# Altium footprint library connecteurs.PcbLib: 162 footprints (part 9 of 11)
Each footprint in its own frame and in the unit in brackets; x right, y up, seen from the top. Pads: shape width x height; smd on the part's side, far side on the other; paste and mask are expansions set on the pad; w line width, h text height; cw(c..) or ccw(c..) is an arc to the next point about the centre after c.
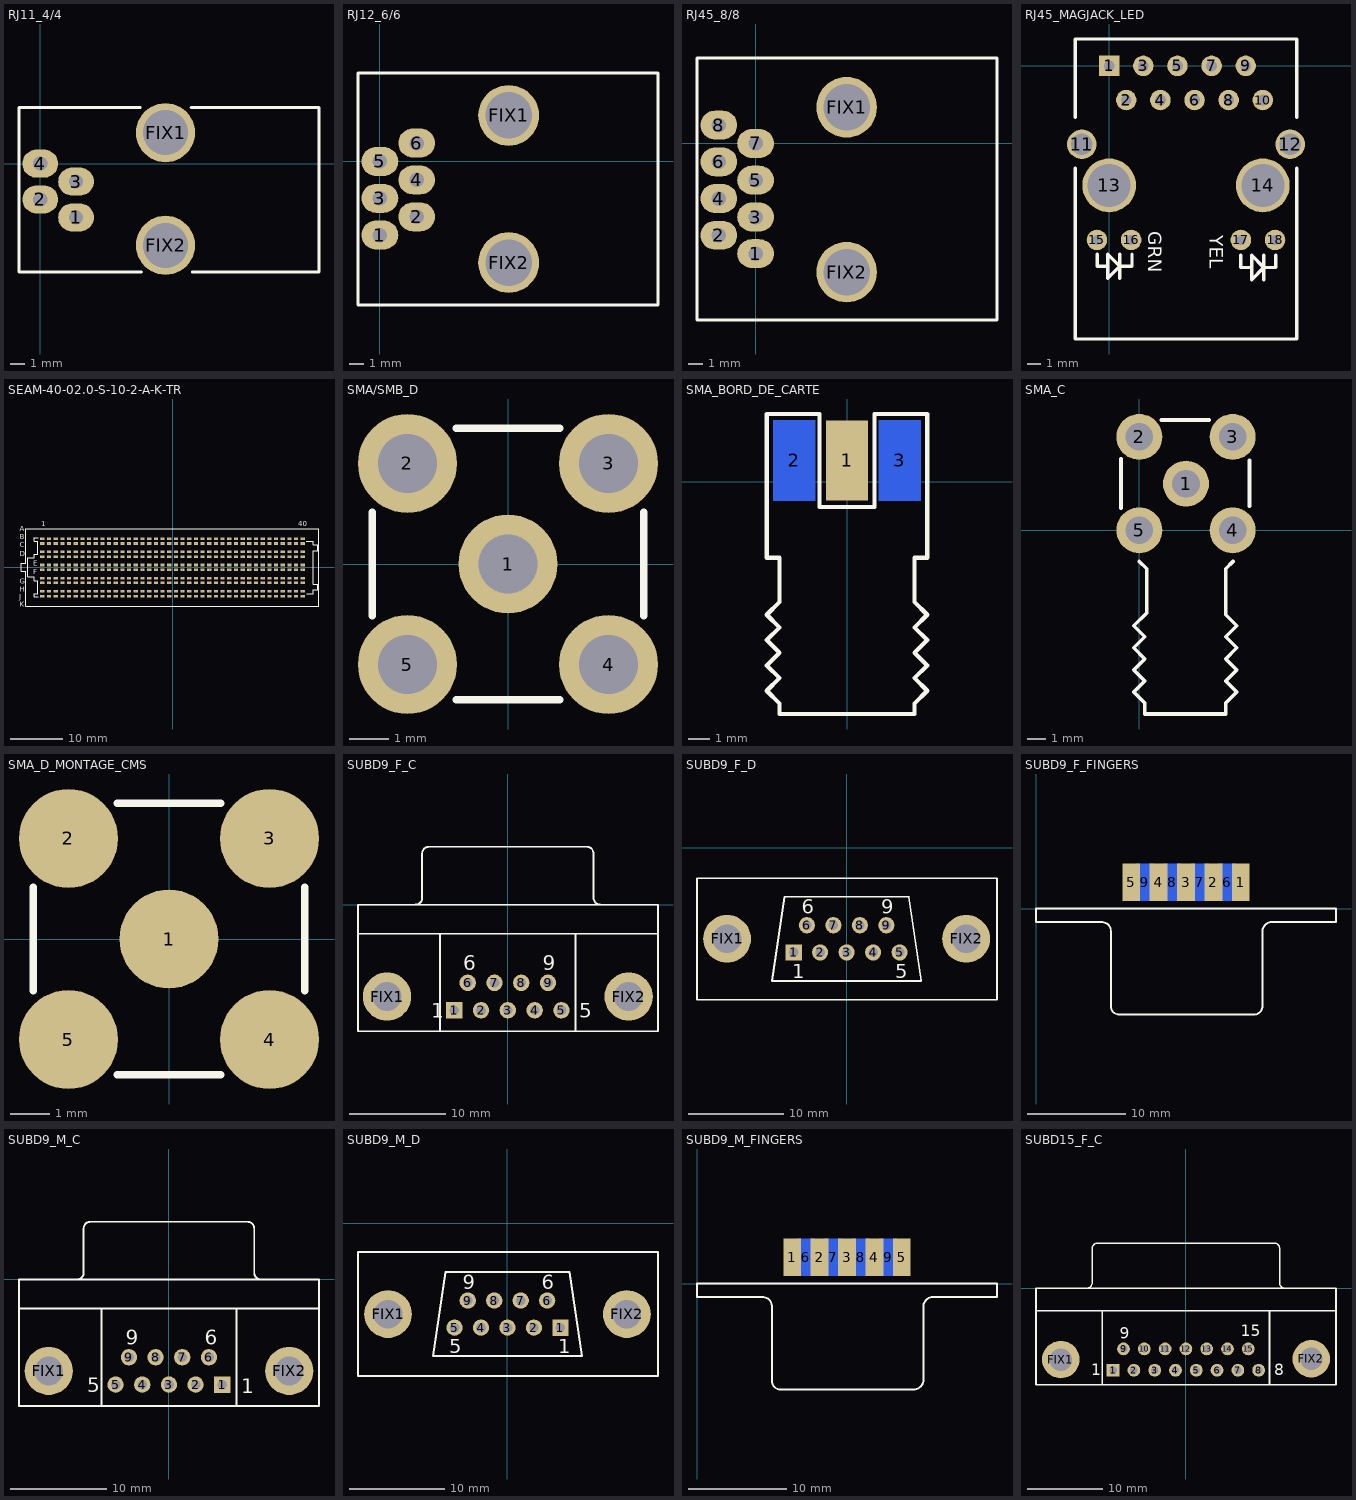
[diagram p8: the footprints below, top view; thin cyan lines are the x and y axes]

## RJ11_4/4 [mm] "RJ11; 4P/4C; BAS PROFIL ; COUDE ; ESPACEMENT BROCHES = 2.54mm"
height 16
pads (6):
  oval 2.54x2 hole 1: 1(2.54,-3.82) 2(0,-2.54) 3(2.54,-1.27) 4(0,0)
  round 4.2 hole 3.2: FIX1(8.9,2.2) FIX2(8.9,-5.8)
Top Overlay:
  lines w0.2: 7.1,4 -1.51,4 -1.51,-7.7 7.2,-7.7 ; 10.7,4 19.8,4 19.8,-7.7 10.8,-7.7
3D body: height 15.99, standoff -3.46, extent -0.985,-7.4 19.585,3.78

## RJ12_6/6 [mm] "RJ12 ; 6P/6C ; BAS PROFIL ; COUDE ; ESPACEMENT BROCHES = 2.54 mm"
height 16
pads (8):
  oval 2.54x2 hole 1: 1(0,-5.08) 2(2.54,-3.82) 3(0,-2.54) 4(2.54,-1.27) 5(0,0) 6(2.54,1.27)
  round 4.2 hole 3.2: FIX1(8.89,3.18) FIX2(8.89,-6.98)
Top Overlay:
  lines w0.2: -1.51,-9.89 -1.51,6.1 7.1,6.1 19.2,6.1 19.2,-9.9 -1.5,-9.9 -1.51,-9.89
3D body: height 16, standoff -4, extent -1.6,-9.8 18.97,5.95

## RJ45_8/8 [mm] "RJ45 ; 8P/8C ; BAS PROFIL ; COUDE ; ESPACEMENT BROCHES = 2.54mm"
height 16
pads (10):
  oval 2.54x2 hole 1: 1(0,-7.62) 2(-2.54,-6.35) 3(0,-5.09) 4(-2.54,-3.81) 5(0,-2.54) 6(-2.54,-1.27) 7(0,0) 8(-2.54,1.27)
  round 4.2 hole 3.2: FIX1(6.3,2.5) FIX2(6.3,-8.9)
Top Overlay:
  lines w0.2: -4.05,-12.2 -4.05,5.9 2.09,5.9 ; -3.985,-12.2 16.7,-12.2 16.7,5.9 2.1,5.9
3D body: height 16, standoff -4, extent -3.985,-12.1 16.585,5.68

## RJ45_MAGJACK_LED [mm]
pads (18):
  rect 1.524x1.524 hole 0.8: 1(0,0)
  round 1.524 hole 0.8: 2(1.27,-2.54) 3(2.54,0) 4(3.81,-2.54) 5(5.08,0) 6(6.35,-2.54) 7(7.62,0) 8(8.89,-2.54) 9(10.16,0) 10(11.43,-2.54)
  round 2.2 hole 1.6: 11(-2.03,-5.84) 12(13.46,-5.84)
  round 4 hole 3.2: 13(0,-8.89) 14(11.43,-8.89)
  round 1.524 hole 0.762: 15(-0.91,-12.95) 16(1.63,-12.95) 17(9.8,-12.95) 18(12.34,-12.95)
Top Overlay:
  lines w0.254: -2.54,-7.62 -2.54,-20.32 13.97,-20.32 13.97,-7.62 ; -2.54,-3.81 -2.54,2 13.97,2 13.97,-3.81 ; -0.9,-14 -0.9,-14.9 -0.2,-14.9 ; 0.8,-15.8 0.8,-14 ; 1.7,-14 1.7,-14.9 0.8,-14.9 ; 9.8,-14.1 9.8,-15 10.5,-15 ; 11.5,-15.9 11.5,-14.1 ; 12.4,-14.1 12.4,-15 11.5,-15 ; 0.8,-14.9 -0.1,-15.8 -0.1,-14 0.8,-14.9 ; 11.5,-15 10.6,-14.1 10.6,-15.9 11.5,-15
  text "YEL" at 7.5,-12.6 h1
  text "GRN" at 2.9,-12.3 h1
3D body: height 13.86, standoff -3.28, extent -2.43,-19.79 13.83,1.8

## SEAM-40-02.0-S-10-2-A-K-TR [mm] "CONNECTEUR SAMTEC - MALE 10 RANGEE - 1.27mm - REFERENCE FARNELL : 2250310"
pads (800):
  rect 0.8x0.5 smd: A1(-24.765,5.45) A2(-23.495,5.45) A3(-22.225,5.45) A4(-20.955,5.45) A5(-19.685,5.45) A6(-18.415,5.45) A7(-17.145,5.45) A8(-15.875,5.45) A9(-14.605,5.45) A10(-13.335,5.45) A11(-12.065,5.45) A12(-10.795,5.45) A13(-9.525,5.45) A14(-8.255,5.45) A15(-6.985,5.45) A16(-5.715,5.45) A17(-4.445,5.45) A18(-3.175,5.45) A19(-1.905,5.45) A20(-0.635,5.45) A21(0.635,5.45) A22(1.905,5.45) A23(3.175,5.45) A24(4.445,5.45) A25(5.715,5.45) A26(6.985,5.45) A27(8.255,5.45) A28(9.525,5.45) A29(10.795,5.45) A30(12.065,5.45) A31(13.335,5.45) A32(14.605,5.45) A33(15.875,5.45) A34(17.145,5.45) A35(18.415,5.45) A36(19.685,5.45) A37(20.955,5.45) A38(22.225,5.45) A39(23.495,5.45) A40(24.765,5.45) B1(-24.765,4.55) B2(-23.495,4.55) B3(-22.225,4.55) B4(-20.955,4.55) B5(-19.685,4.55) B6(-18.415,4.55) B7(-17.145,4.55) B8(-15.875,4.55) B9(-14.605,4.55) B10(-13.335,4.55) B11(-12.065,4.55) B12(-10.795,4.55) B13(-9.525,4.55) B14(-8.255,4.55) B15(-6.985,4.55) B16(-5.715,4.55) B17(-4.445,4.55) B18(-3.175,4.55) B19(-1.905,4.55) B20(-0.635,4.55) B21(0.635,4.55) B22(1.905,4.55) B23(3.175,4.55) B24(4.445,4.55) B25(5.715,4.55) B26(6.985,4.55) B27(8.255,4.55) B28(9.525,4.55) B29(10.795,4.55) B30(12.065,4.55) B31(13.335,4.55) B32(14.605,4.55) B33(15.875,4.55) B34(17.145,4.55) B35(18.415,4.55) B36(19.685,4.55) B37(20.955,4.55) B38(22.225,4.55) B39(23.495,4.55) B40(24.765,4.55) C1(-24.765,2.95) C2(-23.495,2.95) C3(-22.225,2.95) C4(-20.955,2.95) C5(-19.685,2.95) C6(-18.415,2.95) C7(-17.145,2.95) C8(-15.875,2.95) C9(-14.605,2.95) C10(-13.335,2.95) C11(-12.065,2.95) C12(-10.795,2.95) C13(-9.525,2.95) C14(-8.255,2.95) C15(-6.985,2.95) C16(-5.715,2.95) C17(-4.445,2.95) C18(-3.175,2.95) C19(-1.905,2.95) C20(-0.635,2.95) C21(0.635,2.95) C22(1.905,2.95) C23(3.175,2.95) C24(4.445,2.95) C25(5.715,2.95) C26(6.985,2.95) C27(8.255,2.95) C28(9.525,2.95) C29(10.795,2.95) C30(12.065,2.95) C31(13.335,2.95) C32(14.605,2.95) C33(15.875,2.95) C34(17.145,2.95) C35(18.415,2.95) C36(19.685,2.95) C37(20.955,2.95) C38(22.225,2.95) C39(23.495,2.95) C40(24.765,2.95) D1(-24.765,2.05) D2(-23.495,2.05) D3(-22.225,2.05) D4(-20.955,2.05) D5(-19.685,2.05) D6(-18.415,2.05) D7(-17.145,2.05) D8(-15.875,2.05) D9(-14.605,2.05) D10(-13.335,2.05) D11(-12.065,2.05) D12(-10.795,2.05) D13(-9.525,2.05) D14(-8.255,2.05) D15(-6.985,2.05) D16(-5.715,2.05) D17(-4.445,2.05) D18(-3.175,2.05) D19(-1.905,2.05) D20(-0.635,2.05) D21(0.635,2.05) D22(1.905,2.05) D23(3.175,2.05) D24(4.445,2.05) D25(5.715,2.05) D26(6.985,2.05) D27(8.255,2.05) D28(9.525,2.05) D29(10.795,2.05) D30(12.065,2.05) D31(13.335,2.05) D32(14.605,2.05) D33(15.875,2.05) D34(17.145,2.05) D35(18.415,2.05) D36(19.685,2.05) D37(20.955,2.05) D38(22.225,2.05) D39(23.495,2.05) D40(24.765,2.05) E1(-24.765,0.45) E2(-23.495,0.45) E3(-22.225,0.45) E4(-20.955,0.45) E5(-19.685,0.45) E6(-18.415,0.45) E7(-17.145,0.45) E8(-15.875,0.45) E9(-14.605,0.45) E10(-13.335,0.45) E11(-12.065,0.45) E12(-10.795,0.45) E13(-9.525,0.45) E14(-8.255,0.45) E15(-6.985,0.45) E16(-5.715,0.45) E17(-4.445,0.45) E18(-3.175,0.45) E19(-1.905,0.45) E20(-0.635,0.45) E21(0.635,0.45) E22(1.905,0.45) E23(3.175,0.45) E24(4.445,0.45) E25(5.715,0.45) E26(6.985,0.45) E27(8.255,0.45) E28(9.525,0.45) E29(10.795,0.45) E30(12.065,0.45) E31(13.335,0.45) E32(14.605,0.45) E33(15.875,0.45) E34(17.145,0.45) E35(18.415,0.45) E36(19.685,0.45) E37(20.955,0.45) E38(22.225,0.45) E39(23.495,0.45) E40(24.765,0.45) F1(-24.765,-0.45) F2(-23.495,-0.45) F3(-22.225,-0.45) F4(-20.955,-0.45) F5(-19.685,-0.45) F6(-18.415,-0.45) F7(-17.145,-0.45) F8(-15.875,-0.45) F9(-14.605,-0.45) F10(-13.335,-0.45) F11(-12.065,-0.45) F12(-10.795,-0.45) F13(-9.525,-0.45) F14(-8.255,-0.45) F15(-6.985,-0.45) F16(-5.715,-0.45) F17(-4.445,-0.45) F18(-3.175,-0.45) F19(-1.905,-0.45) F20(-0.635,-0.45) F21(0.635,-0.45) F22(1.905,-0.45) F23(3.175,-0.45) F24(4.445,-0.45) F25(5.715,-0.45) F26(6.985,-0.45) F27(8.255,-0.45) F28(9.525,-0.45) F29(10.795,-0.45) F30(12.065,-0.45) F31(13.335,-0.45) F32(14.605,-0.45) F33(15.875,-0.45) F34(17.145,-0.45) F35(18.415,-0.45) F36(19.685,-0.45) F37(20.955,-0.45) F38(22.225,-0.45) F39(23.495,-0.45) F40(24.765,-0.45) G1(-24.765,-2.05) G2(-23.495,-2.05) G3(-22.225,-2.05) G4(-20.955,-2.05) G5(-19.685,-2.05) G6(-18.415,-2.05) G7(-17.145,-2.05) G8(-15.875,-2.05) G9(-14.605,-2.05) G10(-13.335,-2.05) G11(-12.065,-2.05) G12(-10.795,-2.05) G13(-9.525,-2.05) G14(-8.255,-2.05) G15(-6.985,-2.05) G16(-5.715,-2.05) G17(-4.445,-2.05) G18(-3.175,-2.05) G19(-1.905,-2.05) G20(-0.635,-2.05) G21(0.635,-2.05) G22(1.905,-2.05) G23(3.175,-2.05) G24(4.445,-2.05) G25(5.715,-2.05) G26(6.985,-2.05) G27(8.255,-2.05) G28(9.525,-2.05) G29(10.795,-2.05) G30(12.065,-2.05) G31(13.335,-2.05) G32(14.605,-2.05) G33(15.875,-2.05) G34(17.145,-2.05) G35(18.415,-2.05) G36(19.685,-2.05) G37(20.955,-2.05) G38(22.225,-2.05) G39(23.495,-2.05) G40(24.765,-2.05) H1(-24.765,-2.95) H2(-23.495,-2.95) H3(-22.225,-2.95) H4(-20.955,-2.95) H5(-19.685,-2.95) H6(-18.415,-2.95) H7(-17.145,-2.95) H8(-15.875,-2.95) H9(-14.605,-2.95) H10(-13.335,-2.95) H11(-12.065,-2.95) H12(-10.795,-2.95) H13(-9.525,-2.95) H14(-8.255,-2.95) H15(-6.985,-2.95) H16(-5.715,-2.95) H17(-4.445,-2.95) H18(-3.175,-2.95) H19(-1.905,-2.95) H20(-0.635,-2.95) H21(0.635,-2.95) H22(1.905,-2.95) H23(3.175,-2.95) H24(4.445,-2.95) H25(5.715,-2.95) H26(6.985,-2.95) H27(8.255,-2.95) H28(9.525,-2.95) H29(10.795,-2.95) H30(12.065,-2.95) H31(13.335,-2.95) H32(14.605,-2.95) H33(15.875,-2.95) H34(17.145,-2.95) H35(18.415,-2.95) H36(19.685,-2.95) H37(20.955,-2.95) H38(22.225,-2.95) H39(23.495,-2.95) H40(24.765,-2.95) J1(-24.765,-4.55) J2(-23.495,-4.55) J3(-22.225,-4.55) J4(-20.955,-4.55) J5(-19.685,-4.55) J6(-18.415,-4.55) J7(-17.145,-4.55) J8(-15.875,-4.55) J9(-14.605,-4.55) J10(-13.335,-4.55) J11(-12.065,-4.55) J12(-10.795,-4.55) J13(-9.525,-4.55) J14(-8.255,-4.55) J15(-6.985,-4.55) J16(-5.715,-4.55) J17(-4.445,-4.55) J18(-3.175,-4.55) J19(-1.905,-4.55) J20(-0.635,-4.55) J21(0.635,-4.55) J22(1.905,-4.55) J23(3.175,-4.55) J24(4.445,-4.55) J25(5.715,-4.55) J26(6.985,-4.55) J27(8.255,-4.55) J28(9.525,-4.55) J29(10.795,-4.55) J30(12.065,-4.55) J31(13.335,-4.55) J32(14.605,-4.55) J33(15.875,-4.55) J34(17.145,-4.55) J35(18.415,-4.55) J36(19.685,-4.55) J37(20.955,-4.55) J38(22.225,-4.55) J39(23.495,-4.55) J40(24.765,-4.55) K1(-24.765,-5.45) K2(-23.495,-5.45) K3(-22.225,-5.45) K4(-20.955,-5.45) K5(-19.685,-5.45) K6(-18.415,-5.45) K7(-17.145,-5.45) K8(-15.875,-5.45) K9(-14.605,-5.45) K10(-13.335,-5.45) K11(-12.065,-5.45) K12(-10.795,-5.45) K13(-9.525,-5.45) K14(-8.255,-5.45) K15(-6.985,-5.45) K16(-5.715,-5.45) K17(-4.445,-5.45) K18(-3.175,-5.45) K19(-1.905,-5.45) K20(-0.635,-5.45) K21(0.635,-5.45) K22(1.905,-5.45) K23(3.175,-5.45) K24(4.445,-5.45) K25(5.715,-5.45) K26(6.985,-5.45) K27(8.255,-5.45) K28(9.525,-5.45) K29(10.795,-5.45) K30(12.065,-5.45) K31(13.335,-5.45) K32(14.605,-5.45) K33(15.875,-5.45) K34(17.145,-5.45) K35(18.415,-5.45) K36(19.685,-5.45) K37(20.955,-5.45) K38(22.225,-5.45) K39(23.495,-5.45) K40(24.765,-5.45)
  round 0.3 hole 0.15: A1(-24.75,5.45) A2(-23.5,5.45) A3(-22.2,5.45) A4(-20.95,5.45) A5(-19.7,5.45) A6(-18.4,5.45) A7(-17.15,5.45) A8(-15.85,5.45) A9(-14.6,5.45) A10(-13.35,5.45) A11(-12.05,5.45) A12(-10.8,5.45) A13(-9.55,5.45) A14(-8.25,5.45) A15(-7,5.45) A16(-5.7,5.45) A17(-4.45,5.45) A18(-3.2,5.45) A19(-1.9,5.45) A20(-0.65,5.45) A21(0.65,5.45) A22(1.9,5.45) A23(3.15,5.45) A24(4.45,5.45) A25(5.7,5.45) A26(7,5.45) A27(8.25,5.45) A28(9.5,5.45) A29(10.8,5.45) A30(12.05,5.45) A31(13.35,5.45) A32(14.6,5.45) A33(15.85,5.45) A34(17.15,5.45) A35(18.4,5.45) A36(19.7,5.45) A37(20.95,5.45) A38(22.2,5.45) A39(23.5,5.45) A40(24.8,5.45) B1(-24.8,4.55) B2(-23.5,4.55) B3(-22.2,4.55) B4(-20.95,4.55) B5(-19.7,4.55) B6(-18.4,4.55) B7(-17.15,4.55) B8(-15.9,4.55) B9(-14.6,4.55) B10(-13.35,4.55) B11(-12.05,4.55) B12(-10.8,4.55) B13(-9.55,4.55) B14(-8.25,4.55) B15(-7,4.55) B16(-5.7,4.55) B17(-4.45,4.55) B18(-3.2,4.55) B19(-1.9,4.55) B20(-0.65,4.55) B21(0.65,4.55) B22(1.9,4.55) B23(3.15,4.55) B24(4.45,4.55) B25(5.7,4.55) B26(7,4.55) B27(8.25,4.55) B28(9.5,4.55) B29(10.8,4.55) B30(12.05,4.55) B31(13.3,4.55) B32(14.6,4.55) B33(15.85,4.55) B34(17.15,4.55) B35(18.4,4.55) B36(19.7,4.55) B37(20.95,4.55) B38(22.2,4.55) B39(23.5,4.55) B40(24.75,4.55) C1(-24.75,2.95) C2(-23.5,2.95) C3(-22.25,2.95) C4(-20.95,2.95) C5(-19.7,2.95) C6(-18.4,2.95) C7(-17.15,2.95) C8(-15.9,2.95) C9(-14.6,2.95) C10(-13.35,2.95) C11(-12.05,2.95) C12(-10.8,2.95) C13(-9.55,2.95) C14(-8.25,2.95) C15(-7,2.95) C16(-5.75,2.95) C17(-4.45,2.95) C18(-3.2,2.95) C19(-1.9,2.95) C20(-0.65,2.95) C21(0.65,2.95) C22(1.9,2.95) C23(3.15,2.95) C24(4.45,2.95) C25(5.7,2.95) C26(7,2.95) C27(8.25,2.95) C28(9.5,2.95) C29(10.8,2.95) C30(12.05,2.95) C31(13.35,2.95) C32(14.6,2.95) C33(15.9,2.95) C34(17.15,2.95) C35(18.4,2.95) C36(19.7,2.95) C37(20.95,2.95) C38(22.2,2.95) C39(23.5,2.95) C40(24.75,2.95) D1(-24.75,2.05) D2(-23.5,2.05) D3(-22.2,2.05) D4(-20.95,2.05) D5(-19.7,2.05) D6(-18.4,2.05) D7(-17.15,2.05) D8(-15.85,2.05) D9(-14.6,2.05) D10(-13.35,2.05) D11(-12.1,2.05) D12(-10.8,2.05) D13(-9.55,2.05) D14(-8.25,2.05) D15(-7,2.05) D16(-5.7,2.05) D17(-4.45,2.05) D18(-3.2,2.05) D19(-1.95,2.05) D20(-0.65,2.05) D21(0.6,2.05) D22(1.9,2.05) D23(3.15,2.05) D24(4.45,2.05) D25(5.7,2.05) D26(7,2.05) D27(8.25,2.05) D28(9.5,2.05) D29(10.8,2.05) D30(12.05,2.05) D31(13.3,2.05) D32(14.6,2.05) D33(15.9,2.05) D34(17.15,2.05) D35(18.4,2.05) D36(19.7,2.05) D37(20.95,2.05) D38(22.2,2.05) D39(23.5,2.05) D40(24.75,2.05) E1(-24.8,0.45) E2(-23.5,0.45) E3(-22.25,0.45) E4(-20.95,0.45) E5(-19.7,0.45) E6(-18.4,0.45) E7(-17.15,0.45) E8(-15.85,0.45) E9(-14.6,0.45) E10(-13.35,0.45) E11(-12.05,0.45) E12(-10.8,0.45) E13(-9.55,0.45) E14(-8.25,0.45) E15(-7,0.45) E16(-5.7,0.45) E17(-4.45,0.45) E18(-3.15,0.45) E19(-1.9,0.45) E20(-0.65,0.45) E21(0.65,0.45) E22(1.9,0.45) E23(3.15,0.45) E24(4.45,0.45) E25(5.7,0.45) E26(6.95,0.45) E27(8.25,0.45) E28(9.5,0.45) E29(10.8,0.45) E30(12.05,0.45) E31(13.35,0.45) E32(14.6,0.45) E33(15.85,0.45) E34(17.15,0.45) E35(18.4,0.45) E36(19.7,0.45) E37(20.95,0.45) E38(22.2,0.45) E39(23.5,0.45) E40(24.75,0.45) F1(-24.75,-0.45) F2(-23.5,-0.45) F3(-22.25,-0.45) F4(-20.95,-0.45) F5(-19.7,-0.45) F6(-18.4,-0.45) F7(-17.15,-0.45) F8(-15.9,-0.45) F9(-14.6,-0.45) F10(-13.35,-0.45) F11(-12.05,-0.45) F12(-10.8,-0.45) F13(-9.55,-0.45) F14(-8.25,-0.45) F15(-7,-0.45) F16(-5.7,-0.45) F17(-4.45,-0.45) F18(-3.2,-0.45) F19(-1.9,-0.45) F20(-0.65,-0.45) F21(0.65,-0.45) F22(1.9,-0.45) F23(3.15,-0.45) F24(4.45,-0.45) F25(5.7,-0.45) F26(7,-0.45) F27(8.25,-0.45) F28(9.5,-0.45) F29(10.8,-0.45) F30(12.05,-0.45) F31(13.3,-0.45) F32(14.6,-0.45) F33(15.85,-0.45) F34(17.15,-0.45) F35(18.45,-0.45) F36(19.65,-0.45) F37(20.95,-0.45) F38(22.2,-0.45) F39(23.5,-0.45) F40(24.75,-0.45) G1(-24.75,-2.05) G2(-23.5,-2.05) G3(-22.2,-2.05) G4(-20.95,-2.05) G5(-19.7,-2.05) G6(-18.4,-2.05) G7(-17.15,-2.05) G8(-15.9,-2.05) G9(-14.6,-2.05) G10(-13.35,-2.05) G11(-12.05,-2.05) G12(-10.8,-2.05) G13(-9.5,-2.05) G14(-8.25,-2.05) G15(-7,-2.05) G16(-5.7,-2.05) G17(-4.45,-2.05) G18(-3.15,-2.05) G19(-1.9,-2.05) G20(-0.65,-2.05) G21(0.65,-2.05) G22(1.9,-2.05) G23(3.2,-2.05) G24(4.45,-2.05) G25(5.7,-2.05) G26(7,-2.05) G27(8.25,-2.05) G28(9.55,-2.05) G29(10.8,-2.05) G30(12.1,-2.05) G31(13.35,-2.05) G32(14.6,-2.05) G33(15.9,-2.05) G34(17.15,-2.05) G35(18.4,-2.05) G36(19.7,-2.05) G37(20.95,-2.05) G38(22.25,-2.05) G39(23.5,-2.05) G40(24.75,-2.05) H1(-24.75,-2.95) H2(-23.5,-2.95) H3(-22.25,-2.95) H4(-20.95,-2.95) H5(-19.7,-2.95) H6(-18.4,-2.95) H7(-17.15,-2.95) H8(-15.9,-2.95) H9(-14.6,-2.95) H10(-13.35,-2.95) H11(-12.05,-2.95) H12µ(-10.8,-2.95) H13(-9.55,-2.95) H14(-8.25,-2.95) H15(-7,-2.95) H16(-5.7,-2.95) H17(-4.45,-2.95) H18(-3.15,-2.95) H19(-1.9,-2.95) H20(-0.65,-2.95) H21(0.6,-2.95) H22(1.9,-2.95) H23(3.15,-2.95) H24(4.45,-2.95) H25(5.7,-2.95) H26(7,-2.95) H27(8.25,-2.95) H28(9.5,-2.95) H29(10.8,-2.95) H30(12.05,-2.95) H31(13.35,-2.95) H32(14.6,-2.95) H33(15.9,-2.95) H34(17.15,-2.95) H35(18.4,-2.95) H36(19.7,-2.95) H37(20.95,-2.95) H38(22.2,-2.95) H39(23.5,-2.95) H40(24.75,-2.95) J1(-24.75,-4.55) J2(-23.5,-4.55) J3(-22.2,-4.55) J4(-20.95,-4.55) J5(-19.7,-4.55) J6(-18.4,-4.55) J7(-17.15,-4.55) J8(-15.85,-4.55) J9(-14.6,-4.55) J10(-13.3,-4.55) J11(-12.05,-4.55) J12(-10.8,-4.55) J13(-9.55,-4.55) J14(-8.25,-4.55) J15(-7,-4.55) J16(-5.7,-4.55) J17(-4.45,-4.55) J18(-3.15,-4.55) J19(-1.9,-4.55) J20(-0.65,-4.55) J21(0.65,-4.55) J22(1.9,-4.55) J23(3.2,-4.55) J24(4.45,-4.55) J25(5.7,-4.55) J26(7,-4.55) J27(8.25,-4.55) J28(9.55,-4.55) J29(10.8,-4.55) J30(12.05,-4.55) J31(13.35,-4.55) J32(14.6,-4.55) J33(15.85,-4.55) J34(17.15,-4.55) J35(18.4,-4.55) J36(19.7,-4.55) J37(20.95,-4.55) J38(22.25,-4.55) J39(23.5,-4.55) J40(24.75,-4.55) K1(-24.75,-5.45) K2(-23.5,-5.45) K3(-22.2,-5.45) K4(-20.95,-5.45) K5(-19.7,-5.45) K6(-18.45,-5.45) K7(-17.15,-5.45) K8(-15.85,-5.45) K9(-14.6,-5.45) K10(-13.35,-5.45) K11(-12.05,-5.45) K12(-10.8,-5.45) K13(-9.55,-5.45) K14(-8.25,-5.45) K15(-7,-5.45) K16(-5.7,-5.45) K17(-4.45,-5.45) K18(-3.2,-5.45) K19(-1.9,-5.45) K20(-0.65,-5.45) K21(0.65,-5.45) K22(1.9,-5.45) K23(3.15,-5.45) K24(4.45,-5.45) K25(5.7,-5.45) K26(7,-5.45) K27(8.25,-5.45) K28(9.5,-5.45) K29(10.8,-5.45) K30(12.05,-5.45) K31(13.3,-5.45) K32(14.6,-5.45) K33(15.85,-5.45) K34(17.15,-5.45) K35(18.4,-5.45) K36(19.7,-5.45) K37(20.95,-5.45) K38(22.2,-5.45) K39(23.5,-5.45) K40(24.75,-5.45)
Top Overlay:
  lines w0.2: -25.5,-5.6 -26.3,-5.6 -26.3,-5 -25.6,-5 -25.6,-2.5 -26.3,-2.5 -26.3,-1.8 -27.5,-1.8 -27.5,1.8 -26.3,1.8 -26.3,2.5 -25.6,2.5 -25.6,5 -26.3,5 -26.3,5.6 -25.5,5.6 ; 25.4,5 26.8,5 26.8,4.3 27.6,4.3 27.6,3.2 26.8,3.2 26.8,-3.2 27.6,-3.2 27.6,-4.2 26.8,-4.2 26.8,-5 25.5,-5 ; -28.75,-0.7 -28.75,0.8 -27.9,0.8 -27.9,7.35 27.85,7.35 27.85,-7.35 -27.9,-7.35 -27.9,-0.7 -28.75,-0.7
  text "A" at -29.1,6.9 h1
  text "K" at -29.1,-7.5 h1
  text "B" at -29.1,5.4 h1
  text "C" at -29.1,3.8 h1
  text "D" at -29.1,2.1 h1
  text "E" at -26.5,0.3 h1
  text "F" at -26.5,-1.3 h1
  text "G" at -29.1,-3.1 h1
  text "H" at -29.1,-4.6 h1
  text "J" at -29.2,-6.1 h1
  text "1" at -25,7.8 h1
  text "40" at 23.9,7.8 h1
Mechanical 2:
  text "LIGNE <I> NON PRESENTE SUR EMBASE FEMELLE CARTE KINTEX" at -26.7,-9.4 h1

## SMA/SMB_D [mm] "SMA OU SMB ; DROIT ; FEMELLE ; TRAVERSANT ; 50R ; ESPACEMENTS BROCHES = 5.08 mm / 2.54 mm"
height 9
pads (5):
  round 2.5 hole 1.5: 1(0,0) 2(-2.54,2.54) 3(2.54,2.54) 4(2.54,-2.54) 5(-2.54,-2.54)
Top Overlay:
  lines w0.2: -3.43,-1.3 -3.43,1.3 ; -1.3,-3.43 1.3,-3.43 ; -1.3,3.43 1.3,3.43 ; 3.43,-1.3 3.43,1.3
3D body: height 9.53, standoff -3.94, extent -3.5,-3.5 3.5,3.5

## SMA_BORD_DE_CARTE [mm] "SMA ; DROIT; FEMELLE ; MONTAGE BORD DE CARTE ; ESPACEMENT BROCHES = 2.54 mm"
height 3.5
pads (3):
  rect 2x3.8 smd: 1(0,1)
  rect 2x3.8 smd far side: 2(-2.5,1) 3(2.5,1)
Top Overlay:
  lines w0.2: -3.8,-9.9 -3.2,-10.5 -3.2,-11 3.2,-11 3.2,-10.5 3.8,-9.9 3.2,-9.3 3.8,-8.7 ; -3.8,-9.9 -3.8,-9.9 ; -3.8,-9.9 -3.2,-9.3 -3.8,-8.7 ; -3.8,-8.7 -3.8,-8.7 ; -3.8,-8.7 -3.2,-8.1 ; -3.8,-6.3 -3.2,-6.9 -3.8,-7.5 -3.2,-8.1 ; -3.8,-6.3 -3.8,-6.3 ; -3.8,-6.3 -3.2,-5.7 -3.2,-3.6 -3.8,-3.6 -3.8,-3 -3.8,3.2 -1.3,3.2 -1.3,-1.2 1.3,-1.2 1.3,3.2 3.8,3.2 3.8,-3.6 3.2,-3.6 3.2,-5.7 ; -3.2,-8.1 -3.2,-8.1 ; 3.2,-8.1 3.8,-8.7 ; 3.2,-8.1 3.2,-8.1 ; 3.2,-8.1 3.8,-7.5 3.2,-6.9 3.8,-6.3 3.2,-5.7 ; 3.2,-5.7 3.2,-5.7 ; 3.8,-8.7 3.8,-8.7
3D body: height 3.82, standoff -2.53, extent -3.2,-10.165 3.15,3.165

## SMA_C [mm] "SMA ; FEMELLE ; COUDEE ; 50R ; ESPACEMENT BROCHES GND = 5.08mm"
height 13.5
pads (5):
  round 2.5 hole 1.5: 1(2.54,2.54) 2(0,5.08) 3(5.08,5.08) 4(5.08,0) 5(0,0)
Top Overlay:
  lines w0.2: -1,1.2 -1,3.9 ; 0,-1.7 0.4,-2.1 ; 1.2,6 3.8,6 ; 5.1,-1.7 4.7,-2.1 4.7,-4.6 5.3,-5.2 4.7,-5.8 5.3,-6.4 4.7,-7 5.3,-7.6 4.7,-8.2 5.3,-8.8 4.7,-9.4 4.7,-10 0.3,-10 0.3,-9.4 -0.3,-8.8 ; 6,1.3 6,3.8 ; -0.3,-8.8 -0.3,-8.8 ; -0.3,-8.8 0.3,-8.2 -0.3,-7.6 0.3,-7 ; 0.3,-7 0.3,-7 ; 0.3,-7 -0.3,-6.4 0.3,-5.8 ; 0.3,-5.8 0.3,-5.8 ; 0.3,-5.8 -0.3,-5.2 0.4,-4.5 0.4,-2.1 ; 0.4,-2.1 0.4,-2.1
3D body: height 10.16, standoff -3.94, extent -1,-9.1 6,6

## SMA_D_MONTAGE_CMS [mm] "SMA ; DROIT ; FEMELLE ; MONTAGE EN SURFACE ; 50R ; ESPACEMENTS BROCHES = 5.08 mm / 2.54 mm"
height 13
pads (5):
  round 2.5 smd: 1(0,0) 2(-2.54,2.54) 3(2.54,2.54) 4(2.54,-2.54) 5(-2.54,-2.54)
Top Overlay:
  lines w0.2: -3.43,-1.3 -3.43,1.3 ; -1.3,-3.43 1.3,-3.43 ; -1.3,3.43 1.3,3.43 ; 3.43,-1.3 3.43,1.3
3D body: height 13.48, standoff 0.01, extent -3.5,-3.5 3.5,3.5

## SUBD9_F_C [mm] "SUBD; 9 CONTACTS ; FEMELLE ; COUDE ; ESPACEMENT BROCHES = 2.77 mm / 2.8 mm"
height 12.75
pads (11):
  rect 1.7x1.7 hole 1: 1(-5.54,-10.92)
  round 1.7 hole 1: 2(-2.77,-10.92) 3(0,-10.92) 4(2.77,-10.92) 5(5.54,-10.92) 6(-4.155,-8.08) 7(-1.385,-8.08) 8(1.385,-8.08) 9(4.155,-8.08)
  round 5 hole 3: FIX1(-12.495,-9.5) FIX2(12.495,-9.5)
Top Overlay:
  lines w0.2: -15.4,-3 15.4,-3 ; -9.56,0.005 ccw(c-9.56,0.7) -8.865,0.7 -8.865,5.3 ; -8.86,5.305 cw(c-8.165,5.305) -8.165,6 8.165,6 cw(c8.165,5.305) 8.86,5.305 ; -7,-13.08 -7,-3 ; 7,-13.08 7,-3 ; 8.865,5.3 8.865,0.7 ccw(c9.56,0.7) 9.56,0.005 ; -15.5,-13.09 -15.5,0 15.53,0 15.53,-13.09 -15.5,-13.09
  text "1" at -7.9,-11.7 h1.5
  text "5" at 7.4,-11.7 h1.5
  text "9" at 3.6,-6.8 h1.5
  text "6" at -4.6,-6.8 h1.5
3D body: height 12.61, standoff -3.11, extent -15.41,-12.9 15.4,6.175

## SUBD9_F_D [mm] "SUBD ; 9 CONTACTS ; FEMELLE ; DROIT ; ESPACEMENTS BROCHES = 2.77 mm / 2.8 mm"
height 12.75
pads (11):
  rect 1.7x1.7 hole 1: 1(-5.54,-10.92)
  round 1.7 hole 1: 2(-2.77,-10.92) 3(0,-10.92) 4(2.77,-10.92) 5(5.54,-10.92) 6(-4.155,-8.08) 7(-1.385,-8.08) 8(1.385,-8.08) 9(4.155,-8.08)
  round 5 hole 3: FIX1(-12.495,-9.5) FIX2(12.495,-9.5)
Top Overlay:
  lines w0.2: -15.64,-15.87 -15.64,-3.17 15.72,-3.17 15.72,-15.87 -15.64,-15.87 ; -7.8,-13.9 7.8,-13.9 6.5,-5.1 -6.5,-5.1 -7.8,-13.9
  text "1" at -5.7,-13.6 h1.5
  text "5" at 5.1,-13.6 h1.5
  text "9" at 3.6,-6.9 h1.5
  text "6" at -4.7,-6.9 h1.5
3D body: height 12.8, standoff -4.1, extent -15.499,-15.7 15.499,-3.3

## SUBD9_F_FINGERS [mm] "SUBD ; 9 CONTACTS ; FEMELLE ; DROIT ; MONTAGE BORD DE CARTE ; ESPACEMENT BROCHES = 2.8 mm"
height 6.2
pads (9):
  rect 1.8x3.8 smd: 1(20.9,2.7) 2(18.1,2.7) 3(15.3,2.7) 4(12.5,2.7) 5(9.7,2.7)
  rect 1.8x3.8 smd far side: 6(19.5,2.7) 7(16.7,2.7) 8(13.9,2.7) 9(11.1,2.7)
Top Overlay:
  lines w0.2: 24.02,-1.38 30.6,-1.38 30.6,0 0,0 0,-1.38 6.8,-1.38 cw(c6.755,-2.255) 7.63,-2.3 7.63,-10 ccw(c8.465,-9.965) 8.5,-10.8 22.3,-10.8 ccw(c22.25,-9.95) 23.1,-9.9 23.1,-2.3 cw(c24.06,-2.34) 24.1,-1.38
3D body: height 6.26, standoff -6.26, extent -0.09,-13.8 30.69,1.15

## SUBD9_M_C [mm] "SUBD; 9 CONTACTS ; MALE ; COUDE ; PAS = 2.77 mm / 2.8 mm"
height 12.75
pads (11):
  rect 1.7x1.7 hole 1: 1(5.54,-10.92)
  round 1.7 hole 1: 2(2.77,-10.92) 3(0,-10.92) 4(-2.77,-10.92) 5(-5.54,-10.92) 6(4.155,-8.08) 7(1.385,-8.08) 8(-1.385,-8.08) 9(-4.155,-8.08)
  round 5 hole 3: FIX1(-12.495,-9.5) FIX2(12.495,-9.5)
Top Overlay:
  lines w0.2: -15.58,-3 15.58,-3 ; -9.56,0.005 ccw(c-9.56,0.7) -8.865,0.7 -8.865,5.3 ; -8.86,5.305 cw(c-8.165,5.305) -8.165,6 8.165,6 cw(c8.165,5.305) 8.86,5.305 ; -7,-13.17 -7,-3 ; 7,-13.15 7,-3 ; 8.865,5.3 8.865,0.7 ccw(c9.56,0.7) 9.56,0.005 ; -15.58,-13.16 -15.58,0 15.59,0 15.59,-13.16 -15.58,-13.16
  text "1" at 7.5,-11.8 h1.5
  text "5" at -8.5,-11.7 h1.5
  text "9" at -4.5,-6.8 h1.5
  text "6" at 3.7,-6.8 h1.5
3D body: height 12.57, standoff -3.15, extent -15.443,-13 15.443,6.685

## SUBD9_M_D [mm] "SUBD; 9 CONTACTS ; MALE ; PAS = 2.77 mm / 2.8 mm"
height 12.75
pads (11):
  rect 1.7x1.7 hole 1: 1(5.54,-10.92)
  round 1.7 hole 1: 2(2.77,-10.92) 3(0,-10.92) 4(-2.77,-10.92) 5(-5.54,-10.92) 6(4.155,-8.08) 7(1.385,-8.08) 8(-1.385,-8.08) 9(-4.155,-8.08)
  round 5 hole 3: FIX1(-12.495,-9.5) FIX2(12.495,-9.5)
Top Overlay:
  lines w0.2: -15.64,-15.96 -15.64,-3.02 15.75,-3.02 15.75,-15.96 -15.64,-15.96 ; -7.8,-13.9 7.8,-13.9 6.5,-5.1 -6.5,-5.1 -7.8,-13.9
  text "1" at 5.3,-13.6 h1.5
  text "5" at -6.1,-13.6 h1.5
  text "9" at -4.7,-6.9 h1.5
  text "6" at 3.6,-6.9 h1.5
3D body: height 11.84, standoff -4.46, extent -15.394,-15.8 15.594,-3.227

## SUBD9_M_FINGERS [mm] "SUBD ; 9 CONTACTS ; FEMELLE ; DROIT ; MONTAGE BORD DE CARTE ; PAS = 2.8 mm"
height 6.2
pads (9):
  rect 1.8x3.8 smd: 1(9.7,2.7) 2(12.5,2.7) 3(15.3,2.7) 4(18.1,2.7) 5(20.9,2.7)
  rect 1.8x3.8 smd far side: 6(11.1,2.7) 7(13.9,2.7) 8(16.7,2.7) 9(19.5,2.7)
Top Overlay:
  lines w0.2: 6.78,-1.38 0,-1.38 0,0 30.6,0 30.6,-1.38 24.02,-1.38 ; 6.8,-1.38 cw(c6.705,-2.305) 7.63,-2.4 ; 7.63,-9.93 7.63,-2.23 ; 7.63,-9.9 ccw(c8.515,-9.915) 8.5,-10.8 22.1,-10.8 ccw(c22.1,-9.8) 23.1,-9.8 23.1,-2.3 cw(c24.06,-2.34) 24.1,-1.38

## SUBD15_F_C [mm] "SUBD ; 15 CONTACTS ; FEMELLE ; COUDE ; PAS = 2.77 mm / 2.8 mm"
height 12.75
pads (17):
  rect 1.7x1.7 hole 1: 1(-9.695,-10.92)
  round 1.7 hole 1: 2(-6.925,-10.92) 3(-4.155,-10.92) 4(-1.385,-10.92) 5(1.385,-10.92) 6(4.155,-10.92) 7(6.925,-10.92) 8(9.695,-10.92) 9(-8.31,-8.08) 10(-5.54,-8.08) 11(-2.77,-8.08) 12(0,-8.08) 13(2.77,-8.08) 14(5.54,-8.08) 15(8.31,-8.08)
  round 5 hole 3: FIX1(-16.66,-9.5) FIX2(16.7,-9.4)
Top Overlay:
  lines w0.2: -19.96,-3 20,-3 ; -13.195,0.005 ccw(c-13.195,0.7) -12.5,0.7 -12.5,5.3 ; -12.495,5.305 cw(c-11.8,5.305) -11.8,6 11.8,6 cw(c11.8,5.305) 12.495,5.305 ; -11.14,-12.86 -11.14,-3 ; 11.14,-12.86 11.14,-3 ; 12.5,5.3 12.5,0.7 ccw(c13.195,0.7) 13.195,0.005 ; -19.97,-12.86 -19.97,0 20,0 20,-12.86 -19.97,-12.86
  text "1" at -12.6,-11.6 h1.5
  text "8" at 11.8,-11.6 h1.5
  text "15" at 7.3,-6.4 h1.5
  text "9" at -8.8,-6.7 h1.5
3D body: height 12.55, standoff -3.5, extent -19.81,-12.7 19.81,5.7